# Altium schematic symbol library Minh_Lib.SchLib: 619 symbols (part 4 of 4) (continued)
## TAJA107K004RNJ
designator C?  Supplier Part Number 1: 478-8876-1-ND
Cap Tant Solid 100uF 4V A CASE 10% (3.2 X 1.6 X 1.6mm) SMD 3216-18 1.4 Ohm 125C T/R; Manufacturer: Kyocera AVX; Manufacturer Part Number: TAJA107K004RNJ; Dielectric Material: Tantalum; ESR (Equivalent Series Resistance): 1.4R; Leakage Current: 4uA; Polarity: Polar; Dissipation Factor: 30%; Supplier 1: Digi-Key; RoHS: Yes; Category: Tantalum Capacitors; Stock 1: 10000; Pricing 1: 1=0.83000, 10=0.58900, 50=0.44520, 100=0.38780, 500=0.28728, 1000=0.24418 (USD); Mount: Surface Mount; Case/Package: 1206; Case Code (Metric): 3216; Case Code (Imperial): 1206; Weight: 0.000571oz; Min Operating Temperature: -55°C; Max Operating Temperature: 125°C; Capacitance: 100uF; Tolerance: 10%; Package Quantity: 1; Packaging: Tape and Reel; Voltage Rating: 4V; Termination: SMD/SMT; Voltage Rating (DC): 4V; Features: General Purpose; Series: TAJ; Construction: Flat; Length: 3.2mm; Width: 0.063inch; Height: 1.8mm; Height - Seated (Max): 0.071inch; Depth: 1.6mm; Radiation Hardening: No; REACH SVHC: No SVHC; Lead Free: Lead Free; RoHS Compliant: Yes; ComponentLink1URL: https://datasheet.ciiva.com/7720/1680476-7720600.pdf?src-supplier=Element14; ComponentLink1Description: https://datasheet.ciiva.com/7720/1680476-7720600.pdf?src-supplier=Element14; ComponentLink2URL: https://datasheet.ciiva.com/7720/1680476-7720599.pdf?src-supplier=Element14; ComponentLink2Description: https://datasheet.ciiva.com/7720/1680476-7720599.pdf?src-supplier=Element14; ComponentLink3URL: https://datasheet.ciiva.com/7720/1680476-7720598.pdf?src-supplier=Element14; ComponentLink3Description: https://datasheet.ciiva.com/7720/1680476-7720598.pdf?src-supplier=Element14; ComponentLink4URL: https://datasheet.ciiva.com/28609/1680476-28609381.pdf?src-supplier=Element14; ComponentLink4Description: https://datasheet.ciiva.com/28609/1680476-28609381.pdf?src-supplier=Element14; ComponentLink5URL: https://datasheet.ciiva.com/29500/taj-29500175.pdf?src-supplier=Digi-Key; ComponentLink5Description: https://datasheet.ciiva.com/29500/taj-29500175.pdf?src-supplier=Digi-Key; ComponentLink6URL: https://datasheet.ciiva.com/29500/taj-29500174.pdf?src-supplier=Digi-Key; ComponentLink6Description: https://datasheet.ciiva.com/29500/taj-29500174.pdf?src-supplier=Digi-Key
footprint Capacitor/Tantalum  - SMD3216/A - AVX (1206/3216-18 SIZE A-AVX)
pins: 1, 2
text: +

## TAJA154K035RNJ
designator C?  Supplier Part Number 1: 478-2336-1-ND
钽电容 150nF ±10% 35V 21Ω A型3216; Manufacturer: Kyocera AVX; Manufacturer Part Number: TAJA154K035RNJ; Dielectric Material: Tantalum; ESR (Equivalent Series Resistance): 21R; Leakage Current: 500nA; Polarity: Polar; Dissipation Factor: 4%; Q Factor: 4; Supplier 1: Digi-Key; RoHS: Yes; Category: Tantalum Capacitors; Stock 1: 4100; Pricing 1: 1=0.67000, 10=0.47200, 50=0.35680, 100=0.31080, 500=0.23020, 1000=0.19568 (USD); Mount: Surface Mount; Case/Package: 1206; Number of Pins: 2; Case Code (Metric): 3216; Case Code (Imperial): 1206; Weight: 0.000571oz; Min Operating Temperature: -55°C; Max Operating Temperature: 125°C; Capacitance: 150nF; Tolerance: 10%; Packaging: Tape and Reel; Package Quantity: 1; Voltage Rating: 35V; Resistance: 21R; Termination: SMD/SMT; Voltage Rating (DC): 35V; Features: General Purpose; Series: TAJ; Construction: Flat; Length: 3.2mm; Width: 0.063inch; Height: 1.8mm; Height - Seated (Max): 0.071inch; Depth: 1.6mm; Radiation Hardening: No; REACH SVHC: No SVHC; Lead Free: Lead Free; RoHS Compliant: Yes; ComponentLink1URL: https://datasheet.ciiva.com/7853/84652-7853079.pdf?src-supplier=Element14; ComponentLink1Description: https://datasheet.ciiva.com/7853/84652-7853079.pdf?src-supplier=Element14; ComponentLink2URL: https://datasheet.ciiva.com/6092/84652-6092191.pdf?src-supplier=Farnell; ComponentLink2Description: https://datasheet.ciiva.com/6092/84652-6092191.pdf?src-supplier=Farnell; ComponentLink3URL: https://datasheet.ciiva.com/7853/84652-7853078.pdf?src-supplier=Element14; ComponentLink3Description: https://datasheet.ciiva.com/7853/84652-7853078.pdf?src-supplier=Element14; ComponentLink4URL: https://datasheet.ciiva.com/263/taj-263927.pdf?src-supplier=Digi-Key; ComponentLink4Description: https://datasheet.ciiva.com/263/taj-263927.pdf?src-supplier=Digi-Key; ComponentLink5URL: https://datasheet.ciiva.com/263/taj-263926.pdf?src-supplier=Digi-Key; ComponentLink5Description: https://datasheet.ciiva.com/263/taj-263926.pdf?src-supplier=Digi-Key; ComponentLink6URL: https://datasheet.ciiva.com/263/taj-263928.pdf?src-supplier=Digi-Key; ComponentLink6Description: https://datasheet.ciiva.com/263/taj-263928.pdf?src-supplier=Digi-Key; ComponentLink7URL: https://datasheet.ciiva.com/12908/taj-27497-12908955.pdf?src-supplier=Mouser; ComponentLink7Description: https://datasheet.ciiva.com/12908/taj-27497-12908955.pdf?src-supplier=Mouser
footprint Capacitor/Tantalum  - SMD3216/A - AVX (1206/3216-18 SIZE A-AVX)
pins: 1, 2
text: +

## TAJA154K050RNJ
designator C?  Supplier Part Number 1: 6992775
钽电容 150nF ±10% 50V 15Ω A型3216; Manufacturer: Kyocera AVX; Manufacturer Part Number: TAJA154K050RNJ; ESR (Equivalent Series Resistance): 15R; Leakage Current: 500nA; Polarity: Polar; Dissipation Factor: 4%; Supplier 1: RSComponents; RoHS: Yes; Category: Tantalum Capacitors; Stock 1: 1; Pricing 1: 5=0.05900 (USD); Mount: Surface Mount; Case/Package: 1206; Number of Pins: 2; Case Code (Imperial): 1206; Case Code (Metric): 3216; Weight: 0.000571oz; Min Operating Temperature: -55°C; Max Operating Temperature: 125°C; Tolerance: 10%; Packaging: Tape and Reel; Capacitance: 150nF; Voltage Rating: 50V; Package Quantity: 1; Termination: SMD/SMT; Voltage Rating (DC): 50V; Features: General Purpose; Series: TAJ; Construction: Flat; Length: 3.2mm; Width: 1.6mm; Height: 1.8mm; Height - Seated (Max): 0.071inch; Depth: 1.6mm; Radiation Hardening: No; Lead Free: Lead Free; RoHS Compliant: Yes; ComponentLink1URL: https://datasheet.ciiva.com/282/taj-282558.pdf?src-supplier=Digi-Key; ComponentLink1Description: https://datasheet.ciiva.com/282/taj-282558.pdf?src-supplier=Digi-Key; ComponentLink2URL: https://datasheet.ciiva.com/282/taj-282557.pdf?src-supplier=Digi-Key; ComponentLink2Description: https://datasheet.ciiva.com/282/taj-282557.pdf?src-supplier=Digi-Key; ComponentLink3URL: https://datasheet.ciiva.com/282/taj-282559.pdf?src-supplier=Digi-Key; ComponentLink3Description: https://datasheet.ciiva.com/282/taj-282559.pdf?src-supplier=Digi-Key; ComponentLink4URL: https://datasheet.ciiva.com/12885/taj-27497-12885430.pdf?src-supplier=Mouser; ComponentLink4Description: https://datasheet.ciiva.com/12885/taj-27497-12885430.pdf?src-supplier=Mouser
footprint Capacitor/Tantalum  - SMD3216/A - AVX (1206/3216-18 SIZE A-AVX)
pins: 1, 2
text: +

## TAJA224K035RNJ
designator C?  Supplier Part Number 1: 1354021
钽电容 220nF ±10% 35V 18Ω A型3216; Manufacturer: Kyocera AVX; Manufacturer Part Number: TAJA224K035RNJ; Dielectric Material: Tantalum; ESR (Equivalent Series Resistance): 18R; Leakage Current: 500nA; Polarity: Polar; Dissipation Factor: 4%; Q Factor: 4; Supplier 1: RSComponents; RoHS: Yes; Category: Tantalum Capacitors; Stock 1: 1; Pricing 1: 2000=0.17500 (USD); Mount: Surface Mount; Case/Package: 1206; Number of Pins: 2; Case Code (Imperial): 1206; Case Code (Metric): 3216; Weight: 0.000571oz; Min Operating Temperature: -55°C; Max Operating Temperature: 125°C; Tolerance: 10%; Capacitance: 220nF; Packaging: Tape and Reel; Voltage Rating: 35V; Package Quantity: 1; Voltage Rating (DC): 35V; Termination: SMD/SMT; Features: General Purpose; Series: TAJ; Construction: Flat; Length: 3.2mm; Width: 1.6mm; Height: 1.8mm; Height - Seated (Max): 0.071inch; Depth: 1.6mm; Radiation Hardening: No; REACH SVHC: No SVHC; Lead Free: Lead Free; RoHS Compliant: Yes; ComponentLink1URL: https://datasheet.ciiva.com/7853/1680476-7853095.pdf?src-supplier=Element14; ComponentLink1Description: https://datasheet.ciiva.com/7853/1680476-7853095.pdf?src-supplier=Element14; ComponentLink2URL: https://datasheet.ciiva.com/7853/1680476-7853093.pdf?src-supplier=Element14; ComponentLink2Description: https://datasheet.ciiva.com/7853/1680476-7853093.pdf?src-supplier=Element14; ComponentLink3URL: https://datasheet.ciiva.com/7853/1680476-7853094.pdf?src-supplier=Element14; ComponentLink3Description: https://datasheet.ciiva.com/7853/1680476-7853094.pdf?src-supplier=Element14; ComponentLink4URL: https://datasheet.ciiva.com/263/taj-263933.pdf?src-supplier=Digi-Key; ComponentLink4Description: https://datasheet.ciiva.com/263/taj-263933.pdf?src-supplier=Digi-Key; ComponentLink5URL: https://datasheet.ciiva.com/263/taj-263932.pdf?src-supplier=Digi-Key; ComponentLink5Description: https://datasheet.ciiva.com/263/taj-263932.pdf?src-supplier=Digi-Key; ComponentLink6URL: https://datasheet.ciiva.com/263/taj-263934.pdf?src-supplier=Digi-Key; ComponentLink6Description: https://datasheet.ciiva.com/263/taj-263934.pdf?src-supplier=Digi-Key; ComponentLink7URL: https://datasheet.ciiva.com/11217/taj-11217253.pdf?src-supplier=Avnet; ComponentLink7Description: https://datasheet.ciiva.com/11217/taj-11217253.pdf?src-supplier=Avnet
footprint Capacitor/Tantalum  - SMD3216/A - AVX (1206/3216-18 SIZE A-AVX)
pins: 1, 2
text: +

## TAJA224K050RNJ
designator C?  Supplier Part Number 1: 478-2376-1-ND
AVX         TAJA224K050RNJ             Surface Mount Tantalum Capacitor, 0.22 F, 50 V, TAJ Series,  10%, 1206 [3216 Metric]; Manufacturer: Kyocera AVX; Capacitance: 220nF; ESR (Equivalent Series Resistance): 18R; Voltage Rating: 50V; Leakage Current: 500nA; Polarity: Polar; Dissipation Factor: 4%; Voltage: 35V; Supplier 1: Digi-Key; Manufacturer Part Number: TAJA224K050RNJ; RoHS: Yes; Category: Tantalum Capacitors; Stock 1: 3997; Pricing 1: 1=0.63000, 10=0.44300, 50=0.33480, 100=0.29160, 500=0.21596, 1000=0.18357 (USD); Mount: Surface Mount; Case/Package: 1206; Number of Pins: 2; Case Code (Metric): 3216; Case Code (Imperial): 1206; Dielectric Material: Tantalum; Min Operating Temperature: -55°C; Max Operating Temperature: 125°C; Tolerance: 10%; Package Quantity: 1; Packaging: Tape and Reel; Voltage Rating (DC): 50V; Termination: SMD/SMT; Features: General Purpose; Series: TAJ; Construction: Flat; Length: 3.2mm; Width: 1.6mm; Height: 1.8mm; Height - Seated (Max): 0.071inch; Depth: 1.6mm; Radiation Hardening: No; REACH SVHC: No SVHC; Lead Free: Lead Free; RoHS Compliant: Yes; ComponentLink1URL: https://datasheet.ciiva.com/6092/49917-6092219.pdf?src-supplier=Farnell; ComponentLink1Description: https://datasheet.ciiva.com/6092/49917-6092219.pdf?src-supplier=Farnell; ComponentLink2URL: https://datasheet.ciiva.com/7853/49917-7853098.pdf?src-supplier=Element14; ComponentLink2Description: https://datasheet.ciiva.com/7853/49917-7853098.pdf?src-supplier=Element14; ComponentLink3URL: https://datasheet.ciiva.com/6092/49917-6092217.pdf?src-supplier=Farnell; ComponentLink3Description: https://datasheet.ciiva.com/6092/49917-6092217.pdf?src-supplier=Farnell; ComponentLink4URL: https://datasheet.ciiva.com/7853/49917-7853097.pdf?src-supplier=Element14; ComponentLink4Description: https://datasheet.ciiva.com/7853/49917-7853097.pdf?src-supplier=Element14; ComponentLink5URL: https://datasheet.ciiva.com/7853/1680476-7853096.pdf?src-supplier=Element14; ComponentLink5Description: https://datasheet.ciiva.com/7853/1680476-7853096.pdf?src-supplier=Element14; ComponentLink6URL: https://datasheet.ciiva.com/8079/1719052-8079629.pdf?src-supplier=Element14; ComponentLink6Description: https://datasheet.ciiva.com/8079/1719052-8079629.pdf?src-supplier=Element14; ComponentLink7URL: https://datasheet.ciiva.com/28665/taj-28665447.pdf?src-supplier=Element14; ComponentLink7Description: https://datasheet.ciiva.com/28665/taj-28665447.pdf?src-supplier=Element14; ComponentLink8URL: https://datasheet.ciiva.com/263/taj-263909.pdf?src-supplier=Digi-Key; ComponentLink8Description: https://datasheet.ciiva.com/263/taj-263909.pdf?src-supplier=Digi-Key; ComponentLink9URL: https://datasheet.ciiva.com/263/taj-263908.pdf?src-supplier=Digi-Key; ComponentLink9Description: https://datasheet.ciiva.com/263/taj-263908.pdf?src-supplier=Digi-Key; ComponentLink10URL: https://datasheet.ciiva.com/263/taj-263910.pdf?src-supplier=Digi-Key; ComponentLink10Description: https://datasheet.ciiva.com/263/taj-263910.pdf?src-supplier=Digi-Key; ComponentLink11URL: https://datasheet.ciiva.com/12884/taj-27497-12884759.pdf?src-supplier=Mouser; ComponentLink11Description: https://datasheet.ciiva.com/12884/taj-27497-12884759.pdf?src-supplier=Mouser; ComponentLink12URL: https://datasheet.ciiva.com/11217/taj-11217255.pdf?src-supplier=Avnet; ComponentLink12Description: https://datasheet.ciiva.com/11217/taj-11217255.pdf?src-supplier=Avnet
footprint Capacitor/Tantalum  - SMD3216/A - AVX (1206/3216-18 SIZE A-AVX)
pins: 1, 2
text: +

## TAJA334K035RNJ
designator C?  Supplier Part Number 1: 1354033
钽电容 330nF ±10% 35V 15Ω A型3216; Manufacturer: Kyocera AVX; Manufacturer Part Number: TAJA334K035RNJ; Dielectric Material: Tantalum; ESR (Equivalent Series Resistance): 15R; Leakage Current: 500nA; Dissipation Factor: 4%; Polarity: Polar; Q Factor: 4; Supplier 1: RSComponents; RoHS: Yes; Category: Tantalum Capacitors; Stock 1: 1; Pricing 1: 2000=0.10900 (USD); Mount: Surface Mount,PCB; Case/Package: 1206; Number of Pins: 2; Case Code (Metric): 3216; Case Code (Imperial): 1206; Min Operating Temperature: -55°C; Max Operating Temperature: 125°C; Capacitance: 330nF; Tolerance: 10%; Package Quantity: 1; Voltage Rating: 35V; Packaging: Tape and Reel; Voltage Rating (DC): 35V; Termination: SMD/SMT; Voltage: 35V; Features: General Purpose; Series: TAJ; Construction: Flat; Length: 3.2mm; Width: 1.6mm; Height: 1.6mm; Height - Seated (Max): 0.071inch; Depth: 1.6mm; Lead Pitch: 1.1mm; Radiation Hardening: No; REACH SVHC: No SVHC; Lead Free: Lead Free; RoHS Compliant: Yes; ComponentLink1URL: https://datasheet.ciiva.com/7853/1680476-7853100.pdf?src-supplier=Element14; ComponentLink1Description: https://datasheet.ciiva.com/7853/1680476-7853100.pdf?src-supplier=Element14; ComponentLink2URL: https://datasheet.ciiva.com/263/taj-263936.pdf?src-supplier=Digi-Key; ComponentLink2Description: https://datasheet.ciiva.com/263/taj-263936.pdf?src-supplier=Digi-Key; ComponentLink3URL: https://datasheet.ciiva.com/263/taj-263935.pdf?src-supplier=Digi-Key; ComponentLink3Description: https://datasheet.ciiva.com/263/taj-263935.pdf?src-supplier=Digi-Key; ComponentLink4URL: https://datasheet.ciiva.com/263/taj-263937.pdf?src-supplier=Digi-Key; ComponentLink4Description: https://datasheet.ciiva.com/263/taj-263937.pdf?src-supplier=Digi-Key; ComponentLink5URL: https://datasheet.ciiva.com/7853/1680476-7853101.pdf?src-supplier=Element14; ComponentLink5Description: https://datasheet.ciiva.com/7853/1680476-7853101.pdf?src-supplier=Element14; ComponentLink6URL: https://datasheet.ciiva.com/7853/1680476-7853099.pdf?src-supplier=Element14; ComponentLink6Description: https://datasheet.ciiva.com/7853/1680476-7853099.pdf?src-supplier=Element14; ComponentLink7URL: https://datasheet.ciiva.com/12883/taj-27497-12883941.pdf?src-supplier=Mouser; ComponentLink7Description: https://datasheet.ciiva.com/12883/taj-27497-12883941.pdf?src-supplier=Mouser; ComponentLink8URL: https://datasheet.ciiva.com/11217/taj-11217368.pdf?src-supplier=Avnet; ComponentLink8Description: https://datasheet.ciiva.com/11217/taj-11217368.pdf?src-supplier=Avnet; ComponentLink9URL: https://datasheet.ciiva.com/11217/taj-11217159.pdf?src-supplier=Avnet; ComponentLink9Description: https://datasheet.ciiva.com/11217/taj-11217159.pdf?src-supplier=Avnet
footprint Capacitor/Tantalum  - SMD3216/A - AVX (1206/3216-18 SIZE A-AVX)
pins: 1, 2
text: +

## TAJA334K050RNJ
designator C?  Supplier Part Number 1: 8117245
钽电容 330nF ±10% 50V 17Ω A型3216; Manufacturer: Kyocera AVX; Manufacturer Part Number: TAJA334K050RNJ; ESR (Equivalent Series Resistance): 17R; Dissipation Factor: 4%; Supplier 1: Future Electronics; RoHS: Yes; Category: Tantalum Capacitors; Stock 1: 14000; Pricing 1: 2000=0.25500, 4000=0.24000, 6000=0.23000 (USD); Case/Package: 1206; Case Code (Imperial): 1206; Case Code (Metric): 3216; Weight: 0.000571oz; Min Operating Temperature: -55°C; Max Operating Temperature: 125°C; Packaging: Tape and Reel; Voltage Rating: 50V; Tolerance: 10%; Capacitance: 330nF; Termination: SMD/SMT; Voltage Rating (DC): 50V; Series: TAJ; Length: 3.2mm; Width: 1.6mm; Height: 1.6mm; Lead Free: Lead Free; RoHS Compliant: Yes; ComponentLink1URL: https://datasheet.ciiva.com/12911/taj-27497-12911758.pdf?src-supplier=Mouser; ComponentLink1Description: https://datasheet.ciiva.com/12911/taj-27497-12911758.pdf?src-supplier=Mouser
footprint Capacitor/Tantalum  - SMD3216/A - AVX (1206/3216-18 SIZE A-AVX)
pins: 1, 2
text: +

## TAJA474K025RNJ
designator C?  Supplier Part Number 1: TAJA474K025RNJ
钽电容 470nF ±10% 25V 14Ω A型3216; Manufacturer: Kyocera AVX; Dielectric Material: Tantalum; ESR (Equivalent Series Resistance): 14R; Leakage Current: 500nA; Polarity: Polar; Dissipation Factor: 4%; Supplier 1: Arrow Electronics; Manufacturer Part Number: TAJA474K025RNJ; RoHS: Yes; Category: Tantalum Capacitors; Stock 1: 1970; Pricing 1: 1=0.41030, 10=0.40790, 25=0.32040, 50=0.24800, 100=0.20120, 250=0.19910, 500=0.16600, 1000=0.16430 (USD); Mount: Surface Mount; Case/Package: 1206; Number of Pins: 2; Case Code (Metric): 3216; Case Code (Imperial): 1206; Weight: 0.000571oz; Min Operating Temperature: -55°C; Max Operating Temperature: 125°C; Capacitance: 470nF; Tolerance: 10%; Voltage Rating: 25V; Voltage Rating (DC): 25V; Package Quantity: 1; Packaging: Tape and Reel; Termination: SMD/SMT; Features: General Purpose; Series: TAJ; Construction: Flat; Length: 3.2mm; Width: 1.6mm; Height: 1.8mm; Height - Seated (Max): 0.071inch; Depth: 1.6mm; Radiation Hardening: No; REACH SVHC: No SVHC; Lead Free: Lead Free; RoHS Compliant: Yes; ComponentLink1URL: https://datasheet.ciiva.com/263/taj-263954.pdf?src-supplier=Digi-Key; ComponentLink1Description: https://datasheet.ciiva.com/263/taj-263954.pdf?src-supplier=Digi-Key; ComponentLink2URL: https://datasheet.ciiva.com/263/taj-263953.pdf?src-supplier=Digi-Key; ComponentLink2Description: https://datasheet.ciiva.com/263/taj-263953.pdf?src-supplier=Digi-Key; ComponentLink3URL: https://datasheet.ciiva.com/263/taj-263955.pdf?src-supplier=Digi-Key; ComponentLink3Description: https://datasheet.ciiva.com/263/taj-263955.pdf?src-supplier=Digi-Key; ComponentLink4URL: https://datasheet.ciiva.com/7853/1680476-7853102.pdf?src-supplier=Element14; ComponentLink4Description: https://datasheet.ciiva.com/7853/1680476-7853102.pdf?src-supplier=Element14; ComponentLink5URL: https://datasheet.ciiva.com/7853/1680476-7853103.pdf?src-supplier=Element14; ComponentLink5Description: https://datasheet.ciiva.com/7853/1680476-7853103.pdf?src-supplier=Element14; ComponentLink6URL: https://datasheet.ciiva.com/12910/taj-27497-12910950.pdf?src-supplier=Mouser; ComponentLink6Description: https://datasheet.ciiva.com/12910/taj-27497-12910950.pdf?src-supplier=Mouser; ComponentLink7URL: https://datasheet.ciiva.com/11217/taj-11217279.pdf?src-supplier=Avnet; ComponentLink7Description: https://datasheet.ciiva.com/11217/taj-11217279.pdf?src-supplier=Avnet; ComponentLink8URL: https://datasheet.ciiva.com/16200/taj-16200286.pdf?src-supplier=Future+Electronics; ComponentLink8Description: https://datasheet.ciiva.com/16200/taj-16200286.pdf?src-supplier=Future+Electronics; ComponentLink9URL: https://datasheet.ciiva.com/16486/taj-16486152.pdf?src-supplier=Avnet+Asia; ComponentLink9Description: https://datasheet.ciiva.com/16486/taj-16486152.pdf?src-supplier=Avnet+Asia; ComponentLink10URL: https://datasheet.ciiva.com/11217/taj-11217535.pdf?src-supplier=Avnet; ComponentLink10Description: https://datasheet.ciiva.com/11217/taj-11217535.pdf?src-supplier=Avnet
footprint Capacitor/Tantalum  - SMD3216/A - AVX (1206/3216-18 SIZE A-AVX)
pins: 1, 2
text: +

## TAJA474K035RNJ
designator C?  Supplier Part Number 1: TAJA474K035RNJ
钽电容 470nF ±10% 35V 12Ω A型3216; Manufacturer: Kyocera AVX; Dielectric Material: Tantalum; ESR (Equivalent Series Resistance): 12R; Leakage Current: 500nA; Polarity: Polar; Dissipation Factor: 4%; Q Factor: 4; Supplier 1: Arrow Electronics; Manufacturer Part Number: TAJA474K035RNJ; RoHS: Yes; Category: Tantalum Capacitors; Stock 1: 1022; Pricing 1: 1=0.75640, 10=0.63040, 25=0.62470, 100=0.43340, 250=0.39250, 500=0.33350, 1000=0.30460 (USD); Mount: Surface Mount; Case/Package: 1206; Number of Pins: 2; Case Code (Metric): 3216; Case Code (Imperial): 1206; Min Operating Temperature: -55°C; Max Operating Temperature: 125°C; Capacitance: 470nF; Tolerance: 10%; Voltage Rating: 35V; Packaging: Tape and Reel; Package Quantity: 1; Termination: SMD/SMT; Voltage Rating (DC): 35V; Features: General Purpose; Series: TAJ; Construction: Flat; Length: 3.2mm; Width: 0.063inch; Height: 1.8mm; Height - Seated (Max): 0.071inch; Depth: 1.6mm; Lead Pitch: 1.1mm; Radiation Hardening: No; REACH SVHC: No SVHC; Lead Free: Lead Free; RoHS Compliant: Yes; ComponentLink1URL: https://datasheet.ciiva.com/263/taj-263957.pdf?src-supplier=Digi-Key; ComponentLink1Description: https://datasheet.ciiva.com/263/taj-263957.pdf?src-supplier=Digi-Key; ComponentLink2URL: https://datasheet.ciiva.com/263/taj-263956.pdf?src-supplier=Digi-Key; ComponentLink2Description: https://datasheet.ciiva.com/263/taj-263956.pdf?src-supplier=Digi-Key; ComponentLink3URL: https://datasheet.ciiva.com/263/taj-263958.pdf?src-supplier=Digi-Key; ComponentLink3Description: https://datasheet.ciiva.com/263/taj-263958.pdf?src-supplier=Digi-Key; ComponentLink4URL: https://datasheet.ciiva.com/12884/taj-27497-12884485.pdf?src-supplier=Mouser; ComponentLink4Description: https://datasheet.ciiva.com/12884/taj-27497-12884485.pdf?src-supplier=Mouser; ComponentLink5URL: https://datasheet.ciiva.com/15163/getdatasheetpartid-74409-15163157.pdf?src-supplier=Verical; ComponentLink5Description: https://datasheet.ciiva.com/15163/getdatasheetpartid-74409-15163157.pdf?src-supplier=Verical
footprint Capacitor/Tantalum  - SMD3216/A - AVX (1206/3216-18 SIZE A-AVX)
pins: 1, 2
text: +

## TAJA474K050RNJ
designator C?  Supplier Part Number 1: 478-8884-1-ND
钽电容 470nF ±10% 50V 9.5Ω A型3216; Manufacturer: Kyocera AVX; Manufacturer Part Number: TAJA474K050RNJ; ESR (Equivalent Series Resistance): 9.5R; Leakage Current: 500nA; Polarity: Polar; Dissipation Factor: 4%; Supplier 1: Digi-Key; RoHS: Yes; Category: Tantalum Capacitors; Stock 1: 2848; Pricing 1: 1=0.79000, 10=0.56100, 50=0.42420, 100=0.36950, 500=0.27370, 1000=0.23264 (USD); Mount: Surface Mount; Case/Package: 1206; Number of Pins: 2; Case Code (Metric): 3216; Case Code (Imperial): 1206; Weight: 0.000571oz; Min Operating Temperature: -55°C; Max Operating Temperature: 125°C; Capacitance: 470nF; Tolerance: 10%; Package Quantity: 1; Packaging: Tape and Reel; Voltage Rating: 50V; Termination: SMD/SMT; Voltage Rating (DC): 50V; Features: General Purpose; Series: TAJ; Construction: Flat; Length: 3.2mm; Width: 0.063inch; Height: 1.8mm; Height - Seated (Max): 0.071inch; Depth: 1.6mm; Radiation Hardening: No; REACH SVHC: No SVHC; Lead Free: Lead Free; RoHS Compliant: Yes; ComponentLink1URL: https://datasheet.ciiva.com/29500/taj-29500143.pdf?src-supplier=Digi-Key; ComponentLink1Description: https://datasheet.ciiva.com/29500/taj-29500143.pdf?src-supplier=Digi-Key; ComponentLink2URL: https://datasheet.ciiva.com/11218/taj-11218587.pdf?src-supplier=Avnet; ComponentLink2Description: https://datasheet.ciiva.com/11218/taj-11218587.pdf?src-supplier=Avnet
footprint Capacitor/Tantalum  - SMD3216/A - AVX (1206/3216-18 SIZE A-AVX)
pins: 1, 2
text: +

## TAJA684K025RNJ
designator C?  Supplier Part Number 1: TAJA684K025RNJ
钽电容 680nF ±10% 25V 10Ω A型3216; Manufacturer: Kyocera AVX; Dielectric Material: Tantalum; ESR (Equivalent Series Resistance): 10R; Leakage Current: 500nA; Polarity: Polar; Dissipation Factor: 4%; Supplier 1: Arrow Electronics; Manufacturer Part Number: TAJA684K025RNJ; RoHS: Yes; Category: Tantalum Capacitors; Stock 1: 2000; Pricing 1: 1=0.42080, 10=0.33940, 25=0.33600, 100=0.25370, 250=0.25110, 500=0.19360, 1000=0.17680 (USD); Mount: Surface Mount; Case/Package: 1206; Number of Pins: 2; Case Code (Imperial): 1206; Case Code (Metric): 3216; Weight: 0.000571oz; Min Operating Temperature: -55°C; Max Operating Temperature: 125°C; Capacitance: 680nF; Tolerance: 10%; Package Quantity: 2000; Voltage Rating: 25V; Packaging: Tape and Reel; Voltage Rating (DC): 25V; Termination: SMD/SMT; Features: General Purpose; Series: TAJ; Construction: Flat; Length: 3.2mm; Width: 1.6mm; Height: 1.8mm; Height - Seated (Max): 0.071inch; Depth: 1.6mm; Lead Pitch: 1.1mm; Radiation Hardening: No; REACH SVHC: No SVHC; Lead Free: Lead Free; RoHS Compliant: Yes; ComponentLink1URL: https://datasheet.ciiva.com/28564/taj-28564031.pdf?src-supplier=Element14; ComponentLink1Description: https://datasheet.ciiva.com/28564/taj-28564031.pdf?src-supplier=Element14; ComponentLink2URL: https://datasheet.ciiva.com/282/taj-282555.pdf?src-supplier=Digi-Key; ComponentLink2Description: https://datasheet.ciiva.com/282/taj-282555.pdf?src-supplier=Digi-Key; ComponentLink3URL: https://datasheet.ciiva.com/282/taj-282554.pdf?src-supplier=Digi-Key; ComponentLink3Description: https://datasheet.ciiva.com/282/taj-282554.pdf?src-supplier=Digi-Key; ComponentLink4URL: https://datasheet.ciiva.com/282/taj-282556.pdf?src-supplier=Digi-Key; ComponentLink4Description: https://datasheet.ciiva.com/282/taj-282556.pdf?src-supplier=Digi-Key; ComponentLink5URL: https://datasheet.ciiva.com/7853/1680476-7853110.pdf?src-supplier=Element14; ComponentLink5Description: https://datasheet.ciiva.com/7853/1680476-7853110.pdf?src-supplier=Element14; ComponentLink6URL: https://datasheet.ciiva.com/7853/1680476-7853109.pdf?src-supplier=Element14; ComponentLink6Description: https://datasheet.ciiva.com/7853/1680476-7853109.pdf?src-supplier=Element14; ComponentLink7URL: https://datasheet.ciiva.com/11218/taj-11218172.pdf?src-supplier=Avnet; ComponentLink7Description: https://datasheet.ciiva.com/11218/taj-11218172.pdf?src-supplier=Avnet
footprint Capacitor/Tantalum  - SMD3216/A - AVX (1206/3216-18 SIZE A-AVX)
pins: 1, 2
text: +

## TAJA684K035RNJ
designator C?  Supplier Part Number 1: 1354051
钽电容 680nF ±10% 35V 8Ω A型3216; Manufacturer: Kyocera AVX; Manufacturer Part Number: TAJA684K035RNJ; Dielectric Material: Tantalum; ESR (Equivalent Series Resistance): 8R; Leakage Current: 500nA; Polarity: Polar; Dissipation Factor: 4%; Q Factor: 4; Supplier 1: RSComponents; RoHS: Yes; Category: Tantalum Capacitors; Stock 1: 1; Pricing 1: 2000=0.18000, 4000=0.16900 (USD); Mount: Surface Mount; Case/Package: 1206; Number of Pins: 2; Case Code (Metric): 3216; Case Code (Imperial): 1206; Weight: 0.000571oz; Min Operating Temperature: -55°C; Max Operating Temperature: 125°C; Capacitance: 680nF; Tolerance: 10%; Packaging: Tape and Reel; Voltage Rating: 35V; Package Quantity: 1; Resistance: 8R; Termination: SMD/SMT; Voltage Rating (DC): 35V; Features: General Purpose; Series: TAJ; Construction: Flat; Length: 3.2mm; Width: 0.063inch; Height: 1.8mm; Height - Seated (Max): 0.071inch; Depth: 1.6mm; Radiation Hardening: No; REACH SVHC: No SVHC; Lead Free: Lead Free; RoHS Compliant: Yes; ComponentLink1URL: https://datasheet.ciiva.com/6092/84652-6092398.pdf?src-supplier=Farnell; ComponentLink1Description: https://datasheet.ciiva.com/6092/84652-6092398.pdf?src-supplier=Farnell; ComponentLink2URL: https://datasheet.ciiva.com/7853/84652-7853112.pdf?src-supplier=Element14; ComponentLink2Description: https://datasheet.ciiva.com/7853/84652-7853112.pdf?src-supplier=Element14; ComponentLink3URL: https://datasheet.ciiva.com/6092/84652-6092399.pdf?src-supplier=Farnell; ComponentLink3Description: https://datasheet.ciiva.com/6092/84652-6092399.pdf?src-supplier=Farnell; ComponentLink4URL: https://datasheet.ciiva.com/7853/84652-7853111.pdf?src-supplier=Element14; ComponentLink4Description: https://datasheet.ciiva.com/7853/84652-7853111.pdf?src-supplier=Element14; ComponentLink5URL: https://datasheet.ciiva.com/264/taj-264137.pdf?src-supplier=Digi-Key; ComponentLink5Description: https://datasheet.ciiva.com/264/taj-264137.pdf?src-supplier=Digi-Key; ComponentLink6URL: https://datasheet.ciiva.com/264/taj-264136.pdf?src-supplier=Digi-Key; ComponentLink6Description: https://datasheet.ciiva.com/264/taj-264136.pdf?src-supplier=Digi-Key; ComponentLink7URL: https://datasheet.ciiva.com/264/taj-264138.pdf?src-supplier=Digi-Key; ComponentLink7Description: https://datasheet.ciiva.com/264/taj-264138.pdf?src-supplier=Digi-Key; ComponentLink8URL: https://datasheet.ciiva.com/12910/taj-27497-12910765.pdf?src-supplier=Mouser; ComponentLink8Description: https://datasheet.ciiva.com/12910/taj-27497-12910765.pdf?src-supplier=Mouser
footprint Capacitor/Tantalum  - SMD3216/A - AVX (1206/3216-18 SIZE A-AVX)
pins: 1, 2
text: +

## TAJA684K050RNJ
designator C?  Supplier Part Number 1: 6992794P
钽电容 680nF ±10% 50V 7.9Ω A型3216; Manufacturer: Kyocera AVX; Manufacturer Part Number: TAJA684K050RNJ; ESR (Equivalent Series Resistance): 7.9R; Leakage Current: 500nA; Polarity: Polar; Dissipation Factor: 4%; Supplier 1: RSComponents; RoHS: Yes; Category: Tantalum Capacitors; Stock 1: 1; Pricing 1: 10=0.51200, 50=0.43600, 100=0.38500, 250=0.33400, 1000=0.30800 (USD); Mount: Surface Mount; Case/Package: 1206; Number of Pins: 2; Case Code (Imperial): 1206; Case Code (Metric): 3216; Weight: 0.000571oz; Min Operating Temperature: -55°C; Max Operating Temperature: 125°C; Tolerance: 10%; Capacitance: 680nF; Packaging: Tape and Reel; Package Quantity: 2000; Voltage Rating: 50V; Termination: SMD/SMT; Voltage Rating (DC): 50V; Features: General Purpose; Series: TAJ; Construction: Flat; Length: 3.2mm; Width: 1.6mm; Height: 1.8mm; Height - Seated (Max): 0.071inch; Depth: 1.6mm; Radiation Hardening: No; Lead Free: Lead Free; RoHS Compliant: Yes; ComponentLink1URL: https://datasheet.ciiva.com/12908/taj-27497-12908716.pdf?src-supplier=Mouser; ComponentLink1Description: https://datasheet.ciiva.com/12908/taj-27497-12908716.pdf?src-supplier=Mouser; ComponentLink2URL: https://datasheet.ciiva.com/11218/taj-11218654.pdf?src-supplier=Avnet; ComponentLink2Description: https://datasheet.ciiva.com/11218/taj-11218654.pdf?src-supplier=Avnet; ComponentLink3URL: https://datasheet.ciiva.com/17337/taj-17337327.pdf?src-supplier=Avnet+Europe; ComponentLink3Description: https://datasheet.ciiva.com/17337/taj-17337327.pdf?src-supplier=Avnet+Europe; ComponentLink4URL: https://datasheet.ciiva.com/282/taj-282847.pdf?src-supplier=Digi-Key; ComponentLink4Description: https://datasheet.ciiva.com/282/taj-282847.pdf?src-supplier=Digi-Key
footprint Capacitor/Tantalum  - SMD3216/A - AVX (1206/3216-18 SIZE A-AVX)
pins: 1, 2
text: +

## TAJB105K035RNJ
designator C?  Supplier Part Number 1: 1354054
钽电容 1uF ±10% 35V 6.5Ω B型3528; Manufacturer: Kyocera AVX; Manufacturer Part Number: TAJB105K035RNJ; Dielectric Material: Tantalum; ESR (Equivalent Series Resistance): 6.5R; Leakage Current: 500nA; Polarity: Polar; Dissipation Factor: 4%; Q Factor: 4; Supplier 1: RSComponents; RoHS: Yes; Category: Tantalum Capacitors; Stock 1: 1; Pricing 1: 2000=0.16000, 4000=0.13600 (USD); Mount: Surface Mount,PCB; Case/Package: 1210; Number of Pins: 2; Case Code (Imperial): 1210; Case Code (Metric): 3528; Min Operating Temperature: -55°C; Max Operating Temperature: 125°C; Capacitance: 1uF; Tolerance: 10%; Voltage: 35V; Series: TAJ; Construction: Flat; Voltage Rating: 35V; Voltage Rating (DC): 35V; Packaging: Tape and Reel; Package Quantity: 1; Termination: SMD/SMT; Features: General Purpose; Length: 3.5mm; Width: 2.8mm; Height: 1.9mm; Depth: 2.8mm; Height - Seated (Max): 0.083inch; Lead Pitch: 1.4mm; Radiation Hardening: No; RoHS Compliant: Yes; REACH SVHC: No SVHC; Lead Free: Lead Free; ComponentLink1URL: https://datasheet.ciiva.com/26341/559423-da-01-en-tacc-b-3-2-mm-x-2-5-mm-x-1-9-mm-1-0-uf-26341762.pdf?src-supplier=Conrad; ComponentLink1Description: https://datasheet.ciiva.com/26341/559423-da-01-en-tacc-b-3-2-mm-x-2-5-mm-x-1-9-mm-1-0-uf-26341762.pdf?src-supplier=Conrad; ComponentLink2URL: https://datasheet.ciiva.com/18710/taj-eng-18710860.pdf?src-supplier=Distrelec; ComponentLink2Description: https://datasheet.ciiva.com/18710/taj-eng-18710860.pdf?src-supplier=Distrelec; ComponentLink3URL: https://datasheet.ciiva.com/5937/taj-5937943.pdf?src-supplier=Farnell; ComponentLink3Description: https://datasheet.ciiva.com/5937/taj-5937943.pdf?src-supplier=Farnell; ComponentLink4URL: https://datasheet.ciiva.com/7832/taj-7832814.pdf?src-supplier=Element14; ComponentLink4Description: https://datasheet.ciiva.com/7832/taj-7832814.pdf?src-supplier=Element14; ComponentLink5URL: https://datasheet.ciiva.com/7832/1680476-7832454.pdf?src-supplier=Element14; ComponentLink5Description: https://datasheet.ciiva.com/7832/1680476-7832454.pdf?src-supplier=Element14; ComponentLink6URL: https://datasheet.ciiva.com/263/taj-263527.pdf?src-supplier=Digi-Key; ComponentLink6Description: https://datasheet.ciiva.com/263/taj-263527.pdf?src-supplier=Digi-Key; ComponentLink7URL: https://datasheet.ciiva.com/263/taj-263526.pdf?src-supplier=Digi-Key; ComponentLink7Description: https://datasheet.ciiva.com/263/taj-263526.pdf?src-supplier=Digi-Key; ComponentLink8URL: https://datasheet.ciiva.com/263/taj-263528.pdf?src-supplier=Digi-Key; ComponentLink8Description: https://datasheet.ciiva.com/263/taj-263528.pdf?src-supplier=Digi-Key; ComponentLink9URL: https://datasheet.ciiva.com/7832/taj-7832455.pdf?src-supplier=Element14; ComponentLink9Description: https://datasheet.ciiva.com/7832/taj-7832455.pdf?src-supplier=Element14; ComponentLink10URL: https://datasheet.ciiva.com/7832/taj-7832453.pdf?src-supplier=Element14; ComponentLink10Description: https://datasheet.ciiva.com/7832/taj-7832453.pdf?src-supplier=Element14; ComponentLink11URL: https://datasheet.ciiva.com/14596/70001050-14596394.pdf?src-supplier=Allied+Electronics; ComponentLink11Description: https://datasheet.ciiva.com/14596/70001050-14596394.pdf?src-supplier=Allied+Electronics; ComponentLink12URL: https://datasheet.ciiva.com/14596/70001050-14596790.pdf?src-supplier=Allied+Electronics; ComponentLink12Description: https://datasheet.ciiva.com/14596/70001050-14596790.pdf?src-supplier=Allied+Electronics; ComponentLink13URL: https://datasheet.ciiva.com/3004/taj-3004419.pdf?src-supplier=Avnet; ComponentLink13Description: https://datasheet.ciiva.com/3004/taj-3004419.pdf?src-supplier=Avnet; ComponentLink14URL: https://datasheet.ciiva.com/16492/taj-16492837.pdf?src-supplier=Future+Electronics; ComponentLink14Description: https://datasheet.ciiva.com/16492/taj-16492837.pdf?src-supplier=Future+Electronics; ComponentLink15URL: https://datasheet.ciiva.com/3004/taj-3004418.pdf?src-supplier=Avnet; ComponentLink15Description: https://datasheet.ciiva.com/3004/taj-3004418.pdf?src-supplier=Avnet
footprint Capacitor/Tantalum  - SMD3528/B - AVX (1210/3528-15 SIZE B-AVX)
pins: 1, 2
text: +

## TAJB105K050RNJ
designator C?  Supplier Part Number 1: 1354056
钽电容 1uF ±10% 50V 7Ω B型3528; Manufacturer: Kyocera AVX; Manufacturer Part Number: TAJB105K050RNJ; Dielectric Material: Tantalum; ESR (Equivalent Series Resistance): 7R; Leakage Current: 500nA; Polarity: Polar; Dissipation Factor: 6%; Supplier 1: RSComponents; RoHS: Yes; Category: Tantalum Capacitors; Stock 1: 1; Pricing 1: 2000=0.36400 (USD); Mount: Surface Mount; Case/Package: 1210; Number of Pins: 2; Case Code (Metric): 3528; Case Code (Imperial): 1210; Weight: 0.000564oz; Min Operating Temperature: -55°C; Max Operating Temperature: 125°C; Capacitance: 1uF; Tolerance: 10%; Voltage Rating: 50V; Voltage Rating (DC): 50V; Packaging: Tape and Reel; Package Quantity: 1; Termination: SMD/SMT; Features: General Purpose; Series: TAJ; Construction: Flat; Length: 3.5mm; Width: 2.8mm; Height: 2.1mm; Depth: 2.8mm; Height - Seated (Max): 0.083inch; Radiation Hardening: No; REACH SVHC: No SVHC; Lead Free: Lead Free; RoHS Compliant: Yes; ComponentLink1URL: https://datasheet.ciiva.com/7832/49917-7832458.pdf?src-supplier=Element14; ComponentLink1Description: https://datasheet.ciiva.com/7832/49917-7832458.pdf?src-supplier=Element14; ComponentLink2URL: https://datasheet.ciiva.com/7832/49917-7832456.pdf?src-supplier=Element14; ComponentLink2Description: https://datasheet.ciiva.com/7832/49917-7832456.pdf?src-supplier=Element14; ComponentLink3URL: https://datasheet.ciiva.com/7832/1680476-7832457.pdf?src-supplier=Element14; ComponentLink3Description: https://datasheet.ciiva.com/7832/1680476-7832457.pdf?src-supplier=Element14; ComponentLink4URL: https://datasheet.ciiva.com/264/taj-264266.pdf?src-supplier=Digi-Key; ComponentLink4Description: https://datasheet.ciiva.com/264/taj-264266.pdf?src-supplier=Digi-Key; ComponentLink5URL: https://datasheet.ciiva.com/264/taj-264265.pdf?src-supplier=Digi-Key; ComponentLink5Description: https://datasheet.ciiva.com/264/taj-264265.pdf?src-supplier=Digi-Key; ComponentLink6URL: https://datasheet.ciiva.com/264/taj-264267.pdf?src-supplier=Digi-Key; ComponentLink6Description: https://datasheet.ciiva.com/264/taj-264267.pdf?src-supplier=Digi-Key; ComponentLink7URL: https://datasheet.ciiva.com/12911/taj-27497-12911007.pdf?src-supplier=Mouser; ComponentLink7Description: https://datasheet.ciiva.com/12911/taj-27497-12911007.pdf?src-supplier=Mouser; ComponentLink8URL: https://datasheet.ciiva.com/11219/taj-11219658.pdf?src-supplier=Avnet; ComponentLink8Description: https://datasheet.ciiva.com/11219/taj-11219658.pdf?src-supplier=Avnet; ComponentLink9URL: https://datasheet.ciiva.com/15163/getdatasheetpartid-131716-15163501.pdf?src-supplier=Verical; ComponentLink9Description: https://datasheet.ciiva.com/15163/getdatasheetpartid-131716-15163501.pdf?src-supplier=Verical; ComponentLink10URL: https://datasheet.ciiva.com/17337/taj-17337435.pdf?src-supplier=Avnet+Europe; ComponentLink10Description: https://datasheet.ciiva.com/17337/taj-17337435.pdf?src-supplier=Avnet+Europe
footprint Capacitor/Tantalum  - SMD3528/B - AVX (1210/3528-15 SIZE B-AVX)
pins: 1, 2
text: +

## TAJB106K006RNJ
designator C?  Supplier Part Number 1: 38AH2722
Cap Tant Solid 10uF 6.3V B CASE 10%( 3.5 X 2.8 X 1.9mm) Inward L SMD 3528-21 3 Ohm 125C T/R; Manufacturer: Kyocera AVX; Manufacturer Part Number: TAJB106K006RNJ; Dielectric Material: Tantalum; Tolerance: 20%; ESR (Equivalent Series Resistance): 3R; Voltage: 6V; Leakage Current: 600nA; Dissipation Factor: 6%; Polarity: Polar; Supplier 1: Newark; RoHS: Yes; Category: Tantalum Capacitors; Stock 1: 22000; Pricing 1: 1=0.06700, 2000=0.06700 (USD); Mount: Surface Mount,PCB; Case/Package: 1210; Number of Pins: 2; Case Code (Imperial): 1210; Case Code (Metric): 3528; Min Operating Temperature: -55°C; Max Operating Temperature: 125°C; Capacitance: 10uF; Packaging: Tape and Reel; Package Quantity: 1; Voltage Rating: 6.3V; Voltage Rating (DC): 6.3V; Termination: SMD/SMT; Features: General Purpose; Series: TAJ; Construction: Flat; Length: 3.5mm; Width: 2.8mm; Height: 1.9mm; Depth: 2.8mm; Height - Seated (Max): 0.083inch; Lead Pitch: 1.4mm; Radiation Hardening: No; RoHS Compliant: Yes; REACH SVHC: No SVHC; Lead Free: Lead Free; ComponentLink1URL: https://datasheet.ciiva.com/15163/getdatasheetpartid-102150-15163344.pdf?src-supplier=Verical; ComponentLink1Description: https://datasheet.ciiva.com/15163/getdatasheetpartid-102150-15163344.pdf?src-supplier=Verical; ComponentLink2URL: https://datasheet.ciiva.com/14599/70001050-14599205.pdf?src-supplier=Allied+Electronics; ComponentLink2Description: https://datasheet.ciiva.com/14599/70001050-14599205.pdf?src-supplier=Allied+Electronics; ComponentLink3URL: https://datasheet.ciiva.com/5937/taj-5937094.pdf?src-supplier=Farnell; ComponentLink3Description: https://datasheet.ciiva.com/5937/taj-5937094.pdf?src-supplier=Farnell; ComponentLink4URL: https://datasheet.ciiva.com/263/taj-263322.pdf?src-supplier=Digi-Key; ComponentLink4Description: https://datasheet.ciiva.com/263/taj-263322.pdf?src-supplier=Digi-Key; ComponentLink5URL: https://datasheet.ciiva.com/263/taj-263323.pdf?src-supplier=Digi-Key; ComponentLink5Description: https://datasheet.ciiva.com/263/taj-263323.pdf?src-supplier=Digi-Key; ComponentLink6URL: https://datasheet.ciiva.com/263/taj-263324.pdf?src-supplier=Digi-Key; ComponentLink6Description: https://datasheet.ciiva.com/263/taj-263324.pdf?src-supplier=Digi-Key; ComponentLink7URL: https://datasheet.ciiva.com/7730/1680476-7730719.pdf?src-supplier=Element14; ComponentLink7Description: https://datasheet.ciiva.com/7730/1680476-7730719.pdf?src-supplier=Element14; ComponentLink8URL: https://datasheet.ciiva.com/16348/taj-16348815.pdf?src-supplier=Future+Electronics; ComponentLink8Description: https://datasheet.ciiva.com/16348/taj-16348815.pdf?src-supplier=Future+Electronics; ComponentLink9URL: https://datasheet.ciiva.com/14599/70001050-14599429.pdf?src-supplier=Allied+Electronics; ComponentLink9Description: https://datasheet.ciiva.com/14599/70001050-14599429.pdf?src-supplier=Allied+Electronics; ComponentLink10URL: https://datasheet.ciiva.com/8079/1719052-8079532.pdf?src-supplier=Element14; ComponentLink10Description: https://datasheet.ciiva.com/8079/1719052-8079532.pdf?src-supplier=Element14
footprint Capacitor/Tantalum  - SMD3528/B - AVX (1210/3528-15 SIZE B-AVX)
pins: 1, 2
text: +

## TAJB106K010RNJ
designator C?  Supplier Part Number 1: 60R5870
钽电容 10uF ±10% 10V B型3528; Manufacturer: Kyocera AVX; Manufacturer Part Number: TAJB106K010RNJ; Dielectric Material: Tantalum; ESR (Equivalent Series Resistance): 2.5R; Leakage Current: 1uA; Polarity: Polar; Dissipation Factor: 6%; Q Factor: 6; Supplier 1: Newark; RoHS: Yes; Category: Tantalum Capacitors; Stock 1: 2498; Pricing 1: 1=0.57600, 10=0.30400, 25=0.28400, 50=0.26500, 100=0.24600 (USD); Mount: Surface Mount,PCB; Case/Package: 1210; Case Code (Imperial): 1210; Case Code (Metric): 3528; Min Operating Temperature: -55°C; Max Operating Temperature: 125°C; Capacitance: 10uF; Tolerance: 10%; Packaging: Tape and Reel; Voltage Rating: 10V; Voltage Rating (DC): 10V; Package Quantity: 2000; Termination: SMD/SMT; Voltage: 10V; Features: General Purpose; Series: TAJ; Length: 3.5mm; Width: 2.8mm; Height: 1.9mm; Depth: 2.8mm; Height - Seated (Max): 0.083inch; Radiation Hardening: No; RoHS Compliant: Yes; REACH SVHC: No SVHC; Lead Free: Lead Free; ComponentLink1URL: https://datasheet.ciiva.com/11793/0900766b80ccdc61-11793121.pdf?src-supplier=RSComponents; ComponentLink1Description: https://datasheet.ciiva.com/11793/0900766b80ccdc61-11793121.pdf?src-supplier=RSComponents; ComponentLink2URL: https://datasheet.ciiva.com/18710/taj-eng-18710637.pdf?src-supplier=Distrelec; ComponentLink2Description: https://datasheet.ciiva.com/18710/taj-eng-18710637.pdf?src-supplier=Distrelec; ComponentLink3URL: https://datasheet.ciiva.com/28694/taj-28694957.pdf?src-supplier=Element14; ComponentLink3Description: https://datasheet.ciiva.com/28694/taj-28694957.pdf?src-supplier=Element14; ComponentLink4URL: https://datasheet.ciiva.com/263/taj-263575.pdf?src-supplier=Digi-Key; ComponentLink4Description: https://datasheet.ciiva.com/263/taj-263575.pdf?src-supplier=Digi-Key; ComponentLink5URL: https://datasheet.ciiva.com/263/taj-263574.pdf?src-supplier=Digi-Key; ComponentLink5Description: https://datasheet.ciiva.com/263/taj-263574.pdf?src-supplier=Digi-Key; ComponentLink6URL: https://datasheet.ciiva.com/263/taj-263576.pdf?src-supplier=Digi-Key; ComponentLink6Description: https://datasheet.ciiva.com/263/taj-263576.pdf?src-supplier=Digi-Key; ComponentLink7URL: https://datasheet.ciiva.com/14600/70001050-14600839.pdf?src-supplier=Allied+Electronics; ComponentLink7Description: https://datasheet.ciiva.com/14600/70001050-14600839.pdf?src-supplier=Allied+Electronics; ComponentLink8URL: https://datasheet.ciiva.com/14610/70001050-14610252.pdf?src-supplier=Allied+Electronics; ComponentLink8Description: https://datasheet.ciiva.com/14610/70001050-14610252.pdf?src-supplier=Allied+Electronics; ComponentLink9URL: https://datasheet.ciiva.com/16492/taj-16492838.pdf?src-supplier=Future+Electronics; ComponentLink9Description: https://datasheet.ciiva.com/16492/taj-16492838.pdf?src-supplier=Future+Electronics
footprint Capacitor/Tantalum  - SMD3528/B - AVX (1210/3528-15 SIZE B-AVX)
pins: 1, 2
text: +

## TAJB106K016RNJ
designator C?  Supplier Part Number 1: 30H0311
钽电容 10uF ±10% 16V 2.8Ω B型3528; Manufacturer: Kyocera AVX; Manufacturer Part Number: TAJB106K016RNJ; Dielectric Material: Tantalum; ESR (Equivalent Series Resistance): 2.8R; Leakage Current: 1.6uA; Voltage: 10V; Dissipation Factor: 6%; Polarity: Polar; Supplier 1: Newark; RoHS: Yes; Category: Tantalum Capacitors; Stock 1: 2000; Pricing 1: 1=0.15600, 2000=0.15600 (USD); Mount: Surface Mount,PCB; Case/Package: 1210; Number of Pins: 2; Case Code (Metric): 3528; Case Code (Imperial): 1210; Min Operating Temperature: -55°C; Max Operating Temperature: 125°C; Capacitance: 10uF; Tolerance: 10%; Packaging: Tape and Reel; Voltage Rating (DC): 16V; Package Quantity: 1; Voltage Rating: 16V; Termination: SMD/SMT; Features: General Purpose; Series: TAJ; Construction: Flat; Length: 3.5mm; Width: 0.11inch; Height: 1.9mm; Depth: 2.8mm; Height - Seated (Max): 0.083inch; Lead Pitch: 1.4mm; Radiation Hardening: No; REACH SVHC: No SVHC; Lead Free: Lead Free; RoHS Compliant: Yes; ComponentLink1URL: https://datasheet.ciiva.com/26341/559424-da-01-en-tacc-b-3-2-mm-x-2-5-mm-x-1-9-mm-10-uf-26341768.pdf?src-supplier=Conrad; ComponentLink1Description: https://datasheet.ciiva.com/26341/559424-da-01-en-tacc-b-3-2-mm-x-2-5-mm-x-1-9-mm-10-uf-26341768.pdf?src-supplier=Conrad; ComponentLink2URL: https://datasheet.ciiva.com/18710/taj-eng-18710629.pdf?src-supplier=Distrelec; ComponentLink2Description: https://datasheet.ciiva.com/18710/taj-eng-18710629.pdf?src-supplier=Distrelec; ComponentLink3URL: https://datasheet.ciiva.com/7730/1680476-7730725.pdf?src-supplier=Element14; ComponentLink3Description: https://datasheet.ciiva.com/7730/1680476-7730725.pdf?src-supplier=Element14; ComponentLink4URL: https://datasheet.ciiva.com/28608/taj-28608982.pdf?src-supplier=Element14; ComponentLink4Description: https://datasheet.ciiva.com/28608/taj-28608982.pdf?src-supplier=Element14; ComponentLink5URL: https://datasheet.ciiva.com/263/taj-263602.pdf?src-supplier=Digi-Key; ComponentLink5Description: https://datasheet.ciiva.com/263/taj-263602.pdf?src-supplier=Digi-Key; ComponentLink6URL: https://datasheet.ciiva.com/263/taj-263601.pdf?src-supplier=Digi-Key; ComponentLink6Description: https://datasheet.ciiva.com/263/taj-263601.pdf?src-supplier=Digi-Key; ComponentLink7URL: https://datasheet.ciiva.com/263/taj-263603.pdf?src-supplier=Digi-Key; ComponentLink7Description: https://datasheet.ciiva.com/263/taj-263603.pdf?src-supplier=Digi-Key; ComponentLink8URL: https://datasheet.ciiva.com/12911/taj-27497-12911721.pdf?src-supplier=Mouser; ComponentLink8Description: https://datasheet.ciiva.com/12911/taj-27497-12911721.pdf?src-supplier=Mouser; ComponentLink9URL: https://datasheet.ciiva.com/14587/70001050-14587351.pdf?src-supplier=Allied+Electronics; ComponentLink9Description: https://datasheet.ciiva.com/14587/70001050-14587351.pdf?src-supplier=Allied+Electronics; ComponentLink10URL: https://datasheet.ciiva.com/3004/taj-3004425.pdf?src-supplier=Avnet; ComponentLink10Description: https://datasheet.ciiva.com/3004/taj-3004425.pdf?src-supplier=Avnet; ComponentLink11URL: https://datasheet.ciiva.com/16385/taj-16385095.pdf?src-supplier=Future+Electronics; ComponentLink11Description: https://datasheet.ciiva.com/16385/taj-16385095.pdf?src-supplier=Future+Electronics; ComponentLink12URL: https://datasheet.ciiva.com/15163/getdatasheetpartid-120870-15163420.pdf?src-supplier=Verical; ComponentLink12Description: https://datasheet.ciiva.com/15163/getdatasheetpartid-120870-15163420.pdf?src-supplier=Verical; ComponentLink13URL: https://datasheet.ciiva.com/25913/taj-25913340.pdf?src-supplier=Avnet+Europe; ComponentLink13Description: https://datasheet.ciiva.com/25913/taj-25913340.pdf?src-supplier=Avnet+Europe; ComponentLink14URL: https://datasheet.ciiva.com/16538/taj-16538428.pdf?src-supplier=Avnet+Asia; ComponentLink14Description: https://datasheet.ciiva.com/16538/taj-16538428.pdf?src-supplier=Avnet+Asia
footprint Capacitor/Tantalum  - SMD3528/B - AVX (1210/3528-15 SIZE B-AVX)
pins: 1, 2
text: +
